# Altium footprint library mainLib.PcbLib: 169 footprints (part 3 of 11)
Each footprint in its own frame and in the unit in brackets; x right, y up, seen from the top. Pads: shape width x height; smd on the part's side, far side on the other; paste and mask are expansions set on the pad; w line width, h text height; cw(c..) or ccw(c..) is an arc to the next point about the centre after c.
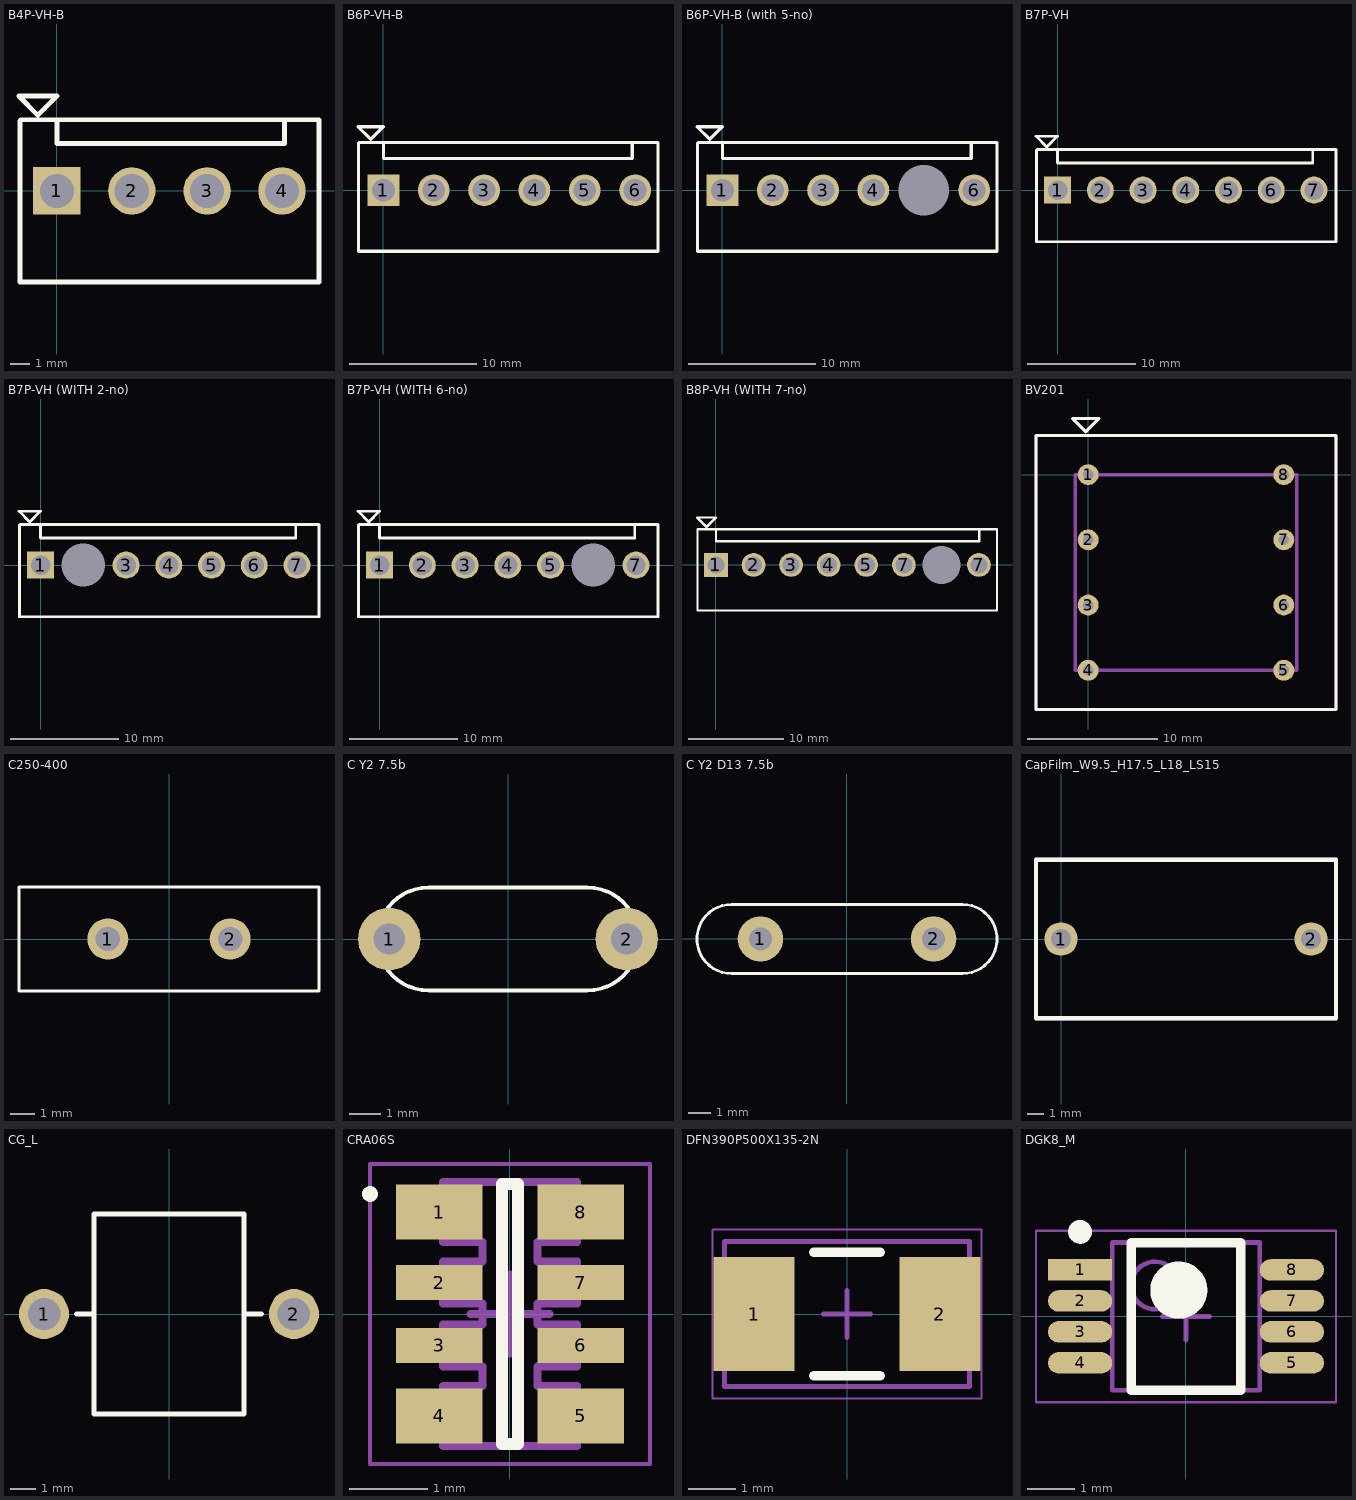
[diagram p2: the footprints below, top view; thin cyan lines are the x and y axes]

## B4P-VH-B [mm]
pads (4):
  rect 2.5x2.5 hole 1.8: 1(0,0)
  round 2.5 hole 1.8: 2(3.95,0) 3(7.925,0) 4(11.875,0)
Top Overlay:
  lines w0.254: 0,3.75 0,2.5 12,2.5 12,3.75 ; -2,5 0,5 -1,4 -2,5 ; -1.95,-4.8 -1.95,3.7 -1.9,3.75 13.825,3.75 13.825,-4.8 -1.95,-4.8
3D body "B4P-VH-B.STEP": height 10.9, standoff -3.7, extent -1.965,-4.8 13.815,3.7

## B6P-VH-B [mm]
pads (6):
  rect 2.5x2.5 hole 1.8: 1(0,0)
  round 2.5 hole 1.8: 2(3.96,0) 3(7.92,0) 4(11.88,0) 5(15.84,0) 6(19.8,0)
Top Overlay:
  lines w0.254: 0,3.75 0,2.5 19.575,2.5 19.575,3.75 ; -2,5 -1,4 0,5 -2,5 ; -1.95,-4.8 21.6,-4.8 21.6,3.75 -1.9,3.75 -1.95,3.7 -1.95,-4.8
3D body "B6P-VH-B.STEP": height 10.9, standoff -3.7, extent -1.925,-4.8 21.775,3.7

## B6P-VH-B (with 5-no) [mm]
pads (6):
  rect 2.5x2.5 hole 1.8: 1(0,0)
  round 2.5 hole 1.8: 2(3.96,0) 3(7.92,0) 4(11.88,0) 6(19.8,0)
  round 0 hole 4: 5(15.84,0)
Top Overlay:
  lines w0.254: 0,3.75 0,2.5 19.575,2.5 19.575,3.75 ; -2,5 0,5 -1,4 -2,5 ; -1.95,-4.8 -1.95,3.7 -1.9,3.75 21.6,3.75 21.6,-4.8 -1.95,-4.8
3D body "B6P-VH-B.STEP": height 10.9, standoff -3.7, extent -1.575,-4.8 22.125,3.7

## B7P-VH [mm]
pads (7):
  rect 2.5x2.5 hole 1.8: 1(0,0)
  round 2.5 hole 1.8: 2(3.96,0) 3(7.92,0) 4(11.88,0) 5(15.84,0) 6(19.8,0) 7(23.76,0)
Top Overlay:
  lines w0.254: 0,3.75 0,2.5 23.65,2.5 23.65,3.75 ; -2,5 -1,4 0,5 -2,5 ; -1.95,-4.8 25.8,-4.8 25.8,3.75 -1.9,3.75 -1.95,3.7 -1.95,-4.8
3D body "B7P-VH.STEP": height 10.9, standoff -3.7, extent -1.98,-4.7 25.68,3.8

## B7P-VH (WITH 2-no) [mm]
pads (7):
  rect 2.5x2.5 hole 1.8: 1(0,0)
  round 0 hole 4: 2(3.96,0)
  round 2.5 hole 1.8: 3(7.92,0) 4(11.88,0) 5(15.84,0) 6(19.8,0) 7(23.76,0)
Top Overlay:
  lines w0.254: 0,3.75 0,2.5 23.65,2.5 23.65,3.75 ; -2,5 0,5 -1,4 -2,5 ; -1.95,-4.8 -1.95,3.7 -1.9,3.75 25.8,3.75 25.8,-4.8 -1.95,-4.8
3D body "B7P-VH.STEP": height 10.9, standoff -3.7, extent -1.98,-4.7 25.68,3.8

## B7P-VH (WITH 6-no) [mm]
pads (7):
  rect 2.5x2.5 hole 1.8: 1(0,0)
  round 2.5 hole 1.8: 2(3.96,0) 3(7.92,0) 4(11.88,0) 5(15.84,0) 7(23.76,0)
  round 0 hole 4: 6(19.8,0)
Top Overlay:
  lines w0.254: 0,3.75 0,2.5 23.65,2.5 23.65,3.75 ; -2,5 -1,4 0,5 -2,5 ; -1.95,-4.8 25.8,-4.8 25.8,3.75 -1.9,3.75 -1.95,3.7 -1.95,-4.8
3D body "B7P-VH.STEP": height 10.9, standoff -3.7, extent -1.98,-4.7 25.68,3.8

## B8P-VH (WITH 7-no) [mm]
pads (8):
  rect 2.5x2.5 hole 1.8: 1(0,0)
  round 2.5 hole 1.8: 2(3.96,0) 3(7.92,0) 4(11.88,0) 5(15.84,0) 7(19.8,0) 7(27.72,0)
  round 0 hole 4: 6(23.76,0)
Top Overlay:
  lines w0.254: 0,3.75 0,2.5 27.75,2.5 27.75,3.75 ; -2,5 0,5 -1,4 -2,5 ; -1.95,-4.8 -1.95,3.7 -1.9,3.75 29.625,3.75 29.625,-4.8 -1.95,-4.8
3D body "B8P-VH-B.STEP": height 10.91, standoff -3.69, extent -1.95,-4.8 29.67,3.7

## BV201 [mm]
pads (8):
  round 1.6 hole 0.8: 1(0,0) 2(0,-5) 3(0,-10) 4(0,-15) 5(15,-15) 6(15,-10) 7(15,-5) 8(15,0)
Top Overlay:
  lines w0.254: -4,-18 19,-18 19,3 -4,3 -4,-18 ; -1.2,4.3 -0.2,3.3 0.8,4.3 -1.2,4.3
Mechanical 13:
  lines w0.254: -4,-18 19,-18 19,3 -4,3 -4,-18 ; -1,-15 16,-15 16,0 -1,0 -1,-15
3D body: height 15.5, standoff 12.5, extent -0.999,-14.999 15.999,-0.001
3D body: height 12.5, standoff 0, extent -4.127,-18.127 19.127,3.127

## C250-400 [mm]
pads (2):
  round 1.7 hole 1: 1(-2.54,0) 2(2.54,0)
Top Overlay:
  lines w0.127: -6.223,-2.159 6.223,-2.159 6.223,2.159 -6.223,2.159 -6.223,-2.159
3D body "Ceramic Multilayer 12.5x4.2 h10.5 F5.08.STEP": height 10.5, standoff -2.54, extent -6.25,-2.1 6.25,2.1

## C Y2 7.5b [mm]
pads (2):
  round 2 hole 1: 1(-3.81,0) 2(3.81,0)
Top Overlay:
  lines w0.127: -2.54,-1.651 cw(c-2.54,0) -2.54,1.651 2.54,1.651 cw(c2.54,0) 2.54,-1.651 -2.54,-1.651
3D body "Ceramic Disc Y1 D10 F7.62mm.STEP": height 12.5, standoff -2.5, extent -4.988,-2 4.989,2

## C Y2 D13 7.5b [mm]
pads (2):
  round 2 hole 1: 1(-3.81,0) 2(3.81,0)
Top Overlay:
  lines w0.127: -5.08,-1.524 cw(c-5.08,0) -5.08,1.524 5.08,1.524 cw(c5.08,0) 5.08,-1.524 -5.08,-1.524
3D body "Ceramic Disc Y1 D13 F7.62mm.STEP": height 15.5, standoff -2.5, extent -6.489,-2 6.49,2

## CapFilm_W9.5_H17.5_L18_LS15 [mm]
pads (2):
  round 2 hole 1.2: 1(0,0) 2(14.986,0)
Top Overlay:
  lines w0.254: -1.499,-4.75 -1.499,0 -1.499,4.75 16.485,4.75 16.485,-4.75 -1.499,-4.75
Mechanical 13:
  lines w0.254: -1.499,-4.75 -1.499,0 -1.499,4.75 16.485,4.75 16.485,-4.75 -1.499,-4.75
3D body: height 17.5, standoff 0, extent -1.498,-4.749 16.484,4.749

## CG_L [mm]
height 10
pads (2):
  round 2 hole 1.3: 1(-5,0) 2(5,0)
Top Overlay:
  lines w0.203: -3.7,0 -3,0 ; 3,0 3.7,0 ; -3,-4 3,-4 3,4 -3,4 -3,-4
3D body "CG_L.stp": height 9.55, standoff -2.51, extent -5.4,-4.05 5.4,4.05

## CRA06S [mm] "Chip Array, ConvexS, 8-Leads, Pitch 0,80mm,  Body 3,20x1,50mm,  IPC Low Density"
height 0.6
pads (8):
  rect 1.1x0.7 smd: 1(-0.9,1.295) 4(-0.9,-1.295) 5(0.9,-1.295) 8(0.9,1.295)
  rect 1.1x0.45 smd: 2(-0.9,0.4) 3(-0.9,-0.4) 6(0.9,-0.4) 7(0.9,0.4)
Top Overlay:
  circle w0.1: c-1.778,1.524 r0.05
  lines w0.152: -0.102,-1.651 0.102,-1.651 0.102,1.651 -0.102,1.651 -0.102,-1.651
Mechanical 13:
  lines w0.1: -0.85,-1.675 0.85,-1.675 0.85,-0.915 0.35,-0.915 0.35,-0.665 0.85,-0.665 0.85,-0.135 0.35,-0.135 0.35,0.135 0.85,0.135 0.85,0.665 0.35,0.665 0.35,0.915 0.85,0.915 0.85,1.675 -0.85,1.675 -0.85,0.915 -0.35,0.915 -0.35,0.665 -0.85,0.665 -0.85,0.135 -0.35,0.135 -0.35,-0.135 -0.85,-0.135 -0.85,-0.665 -0.35,-0.665 -0.35,-0.915 -0.85,-0.915 -0.85,-1.675
Mechanical 15:
  lines w0.05: -1.778,-1.905 1.778,-1.905 1.778,1.905 -1.778,1.905 -1.778,-1.905
  lines w0.1: -0.5,0 0.5,0 ; 0,-0.5 0,0.5
3D body "CAC-80P319X150-8M.step": height 0.6, standoff 0, extent -0.875,-1.675 0.875,1.675

## DFN390P500X135-2N [mm] "DFN, 2-Leads, Body 3,20x5,00mm, Pitch 3,90mm, Quartz Crystal"
height 1.35
pads (2):
  rect 1.7x2.4 smd: 1(-1.95,0) 2(1.95,0)
Top Overlay:
  lines w0.2: -0.7,-1.3 0.7,-1.3 ; -0.7,1.3 0.7,1.3
Mechanical 13:
  lines w0.1: -2.575,-1.525 2.575,-1.525 2.575,1.525 -2.575,1.525 -2.575,-1.525
Mechanical 15:
  lines w0.05: -2.825,-1.775 2.825,-1.775 2.825,1.775 -2.825,1.775 -2.825,-1.775
  lines w0.1: -0.5,0 0.5,0 ; 0,-0.5 0,0.5
3D body: height 1.35, standoff 0, extent -2.575,-1.525 2.575,1.525

## DGK8_M [mm] "TSOP, 8-Leads, Body 3,00x3,00mm, Pitch 0,65mm, IPC Medium Density"
height 1.1
pads (8):
  rect 1.35x0.45 smd: 1(-2.225,0.975)
  oval 1.35x0.45 smd: 2(-2.225,0.325) 3(-2.225,-0.325) 4(-2.225,-0.975) 5(2.225,-0.975) 6(2.225,-0.325) 7(2.225,0.325) 8(2.225,0.975)
Top Overlay:
  circle w0.6: c-0.15,0.55 r0.3
  circle w0.25: c-2.225,1.775 r0.125
  lines w0.2: -1.15,-1.55 1.15,-1.55 1.15,1.55 -1.15,1.55 -1.15,-1.55
Mechanical 13:
  circle w0.1: c-0.65,0.65 r0.5
  lines w0.1: -1.55,-1.55 1.55,-1.55 1.55,1.55 -1.55,1.55 -1.55,-1.55
Mechanical 15:
  lines w0.05: -3.15,-1.8 3.15,-1.8 3.15,1.8 -3.15,1.8 -3.15,-1.8
  lines w0.1: -0.5,0 0.5,0 ; 0,-0.5 0,0.5
3D body "TSOP65P490X110-8N.step": height 1.1, standoff 0, extent -2.45,-1.55 2.45,1.55